# Altium footprint library PCB_ConnectorHDR.PcbLib: 221 footprints (part 3 of 14)
Each footprint in its own frame and in the unit in brackets; x right, y up, seen from the top. Pads: shape width x height; smd on the part's side, far side on the other; paste and mask are expansions set on the pad; w line width, h text height; cw(c..) or ccw(c..) is an arc to the next point about the centre after c.
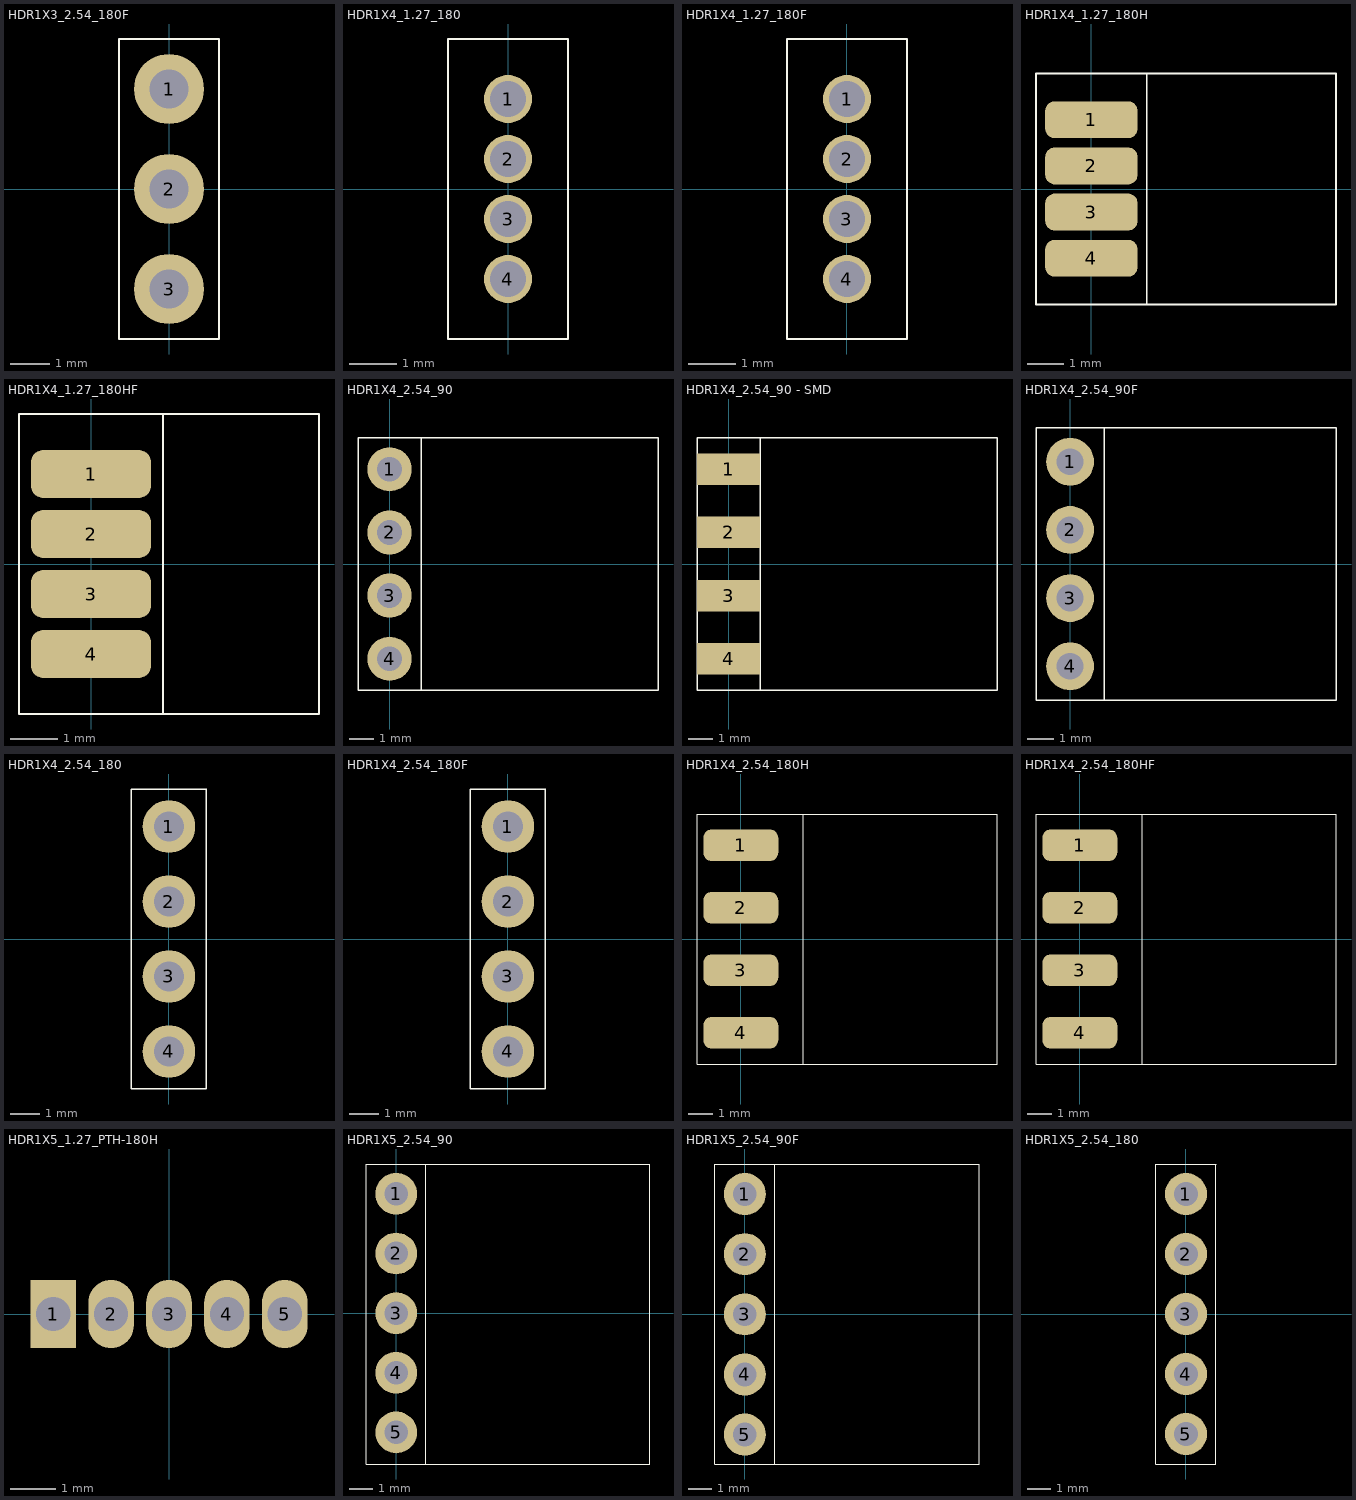
[diagram p2: the footprints below, top view; thin cyan lines are the x and y axes]

## HDR1X3_2.54_180F [mil]
height 169.29
pads (3):
  round 70 hole 39.37: 1(0,100) 2(0,0) 3(0,-100)
Top Overlay:
  lines w2: -50,-150 50,-150 ; -50,-150 -50,150 ; -50,-150 50,-150 ; -50,-150 -50,150 ; -50,150 50,150 ; -50,150 50,150 ; 50,-150 50,150 ; 50,-150 50,150
3D body "female_header_a-bl254-eg-g03d.stp": height 334.65, standoff -125.98, extent -49.21,-154.91 49.22,154.92

## HDR1X4_1.27_180 [mil]
height 169.29
pads (4):
  round 40 hole 30: 1(0,75) 2(0,25) 3(0,-25) 4(0,-75)
Top Overlay:
  lines w2: -50,-125 50,-125 ; -50,-125 -50,125 ; -50,-125 50,-125 ; -50,-125 -50,125 ; -50,125 50,125 ; -50,125 50,125 ; 50,-125 50,125 ; 50,-125 50,125
3D body "pin_header_a-sl127-eg-g04d.stp": height 210.24, standoff -102.36, extent -49.21,-99.99 49.21,100.01

## HDR1X4_1.27_180F [mil]
height 169.29
pads (4):
  round 40 hole 30: 1(0,75) 2(0,25) 3(0,-25) 4(0,-75)
Top Overlay:
  lines w2: -50,-125 -50,125 ; -50,-125 50,-125 ; -50,-125 -50,125 ; -50,-125 50,-125 ; -50,125 50,125 ; -50,125 50,125 ; 50,-125 50,125 ; 50,-125 50,125
3D body "female_header_a-bl127-eg-g04d.stp": height 133.86, standoff -94.49, extent -35.87,-107.88 35,107.88

## HDR1X4_1.27_180H [mil]
height 169.29
pads (4):
  rrect50% 100x40 smd: 1(0,75) 2(0,25) 3(0,-25) 4(0,-75)
Top Overlay:
  lines w2: -60,-125 265,-125 265,125 -60,125 ; -60,-125 -60,125 ; -60,-125 60,-125 60,125 -60,125 ; -60,-125 -60,125
3D body "pin_header_a-sl127-eg-g04d.stp": height 59.21, standoff -39.21, extent -47.36,-99.99 265.24,100.01

## HDR1X4_1.27_180HF [mil]
height 169.29
pads (4):
  rrect50% 100x40 smd: 1(0,75) 2(0,25) 3(0,-25) 4(0,-75)
Top Overlay:
  lines w2: -60,-125 -60,125 ; -60,-125 60,-125 60,125 -60,125 ; -60,-125 190,-125 190,125 -60,125 ; -60,-125 -60,125
3D body "female_header_a-bl127-eg-g04d.stp": height 45.43, standoff -25.43, extent -38.35,-107.88 190,107.88

## HDR1X4_2.54_90 [mil]
height 169.29
pads (4):
  round 70 hole 39.37: 1(0,150) 2(0,50) 3(0,-50) 4(0,-150)
Top Overlay:
  lines w2: -50,-200 50,-200 50,200 -50,200 ; -50,-200 -50,200 ; -50,-200 -50,200 ; -50,-200 425,-200 425,200 -50,200
3D body "pin_header_aw140-ea-g04g.stp": height 99.21, standoff -93.7, extent -14.96,-196.06 423.62,196.07

## HDR1X4_2.54_90 - SMD [mil]
height 169.29
pads (4):
  rect 100x50 smd: 1(0,150) 2(0,50) 3(0,-50) 4(0,-150)
Top Overlay:
  lines w2: -50,-200 -50,200 ; -50,-200 50,-200 50,200 -50,200 ; -50,-200 425,-200 425,200 -50,200 ; -50,-200 -50,200
3D body "pin_header_a-sl254-ea-z04mp1.stp": height 98.93, standoff 0.5, extent -29.11,-200 423.65,200

## HDR1X4_2.54_90F [mil]
height 169.29
pads (4):
  round 70 hole 39.37: 1(0,150) 2(0,50) 3(0,-50) 4(0,-150)
Top Overlay:
  lines w2: -50,-200 -50,200 ; -50,-200 390,-200 390,200 -50,200 ; -50,-200 50,-200 50,200 -50,200 ; -50,-200 -50,200
3D body "female_header_a-bl254-ea-g04d.stp": height 99.21, standoff -125.2, extent -10,-204.92 386.06,204.92

## HDR1X4_2.54_180 [mil]
height 169.29
pads (4):
  round 70 hole 39.37: 1(0,150) 2(0,50) 3(0,-50) 4(0,-150)
Top Overlay:
  lines w2: -50,-200 -50,200 ; -50,-200 50,-200 ; -50,-200 -50,200 ; -50,-200 50,-200 ; -50,200 50,200 ; -50,200 50,200 ; 50,-200 50,200 ; 50,-200 50,200
3D body "pin_header_aw140-eg-g04d.stp": height 322.83, standoff -118.11, extent -49.18,-200 49.18,200

## HDR1X4_2.54_180F [mil]
height 169.29
pads (4):
  round 70 hole 39.37: 1(0,150) 2(0,50) 3(0,-50) 4(0,-150)
Top Overlay:
  lines w2: -50,-200 50,-200 ; -50,-200 -50,200 ; -50,-200 50,-200 ; -50,-200 -50,200 ; -50,200 50,200 ; -50,200 50,200 ; 50,-200 50,200 ; 50,-200 50,200
3D body "User Library-ZL262-4SG.step": height 330.71, standoff -124.02, extent -49.43,-199 49,201

## HDR1X4_2.54_180H [mil]
height 169.29
pads (4):
  rrect50% 120x50 smd: 1(0,150) 2(0,50) 3(0,-50) 4(0,-150)
Top Overlay:
  lines w2: -70,-200 410,-200 410,200 -70,200 ; -70,-200 -70,200 ; -70,-200 -70,200 ; -70,-200 100,-200 100,200 -70,200
3D body "pin_header_aw140-eg-g04d.stp": height 61.32, standoff -37.05, extent -35,-200 405.94,200

## HDR1X4_2.54_180HF [mil]
height 169.29
pads (4):
  rrect50% 120x50 smd: 1(0,150) 2(0,50) 3(0,-50) 4(0,-150)
Top Overlay:
  lines w2: -70,-200 -70,200 ; -70,-200 100,-200 100,200 -70,200 ; -70,-200 410,-200 410,200 -70,200 ; -70,-200 -70,200

## HDR1X5_1.27_PTH-180H [mm]
pads (5):
  rect 1x1.5 hole 0.75: 1(-2.54,0)
  oval 1x1.5 hole 0.75: 2(-1.27,0) 3(0,0) 4(1.27,0) 5(2.54,0)
3D body "_ _ _B051NGCN-RC.STEP": height 2.21, standoff -2.29, extent -3.375,0 3.375,4.975

## HDR1X5_2.54_90 [mil]
height 169.29
pads (5):
  round 70 hole 39.37: 1(0,200) 2(0,100) 3(0,0) 4(0,-100) 5(0,-200)
Top Overlay:
  lines w2: -50,-253 425,-253 425,250 -50,250 ; -50,-253 -50,250 ; -50,-253 50,-253 50,250 -50,250 ; -50,-253 -50,250
3D body "pin_header_aw140-ea-g05g.stp": height 98.93, standoff -93.99, extent -12.96,-247.06 425.62,245.06

## HDR1X5_2.54_90F [mil]
height 169.29
pads (5):
  round 70 hole 39.37: 1(0,200) 2(0,100) 3(0,0) 4(0,-100) 5(0,-200)
Top Overlay:
  lines w2: -50,-249 390,-249 390,250 -50,250 ; -50,-249 -50,250 ; -50,-249 -50,250 ; -50,-249 50,-249 50,250 -50,250
3D body "female_header_a-bl254-ea-g05d.stp": height 98.93, standoff -125.48, extent -9,-254.84 387.06,255

## HDR1X5_2.54_180 [mil]
height 169.29
pads (5):
  round 70 hole 39.37: 1(0,200) 2(0,100) 3(0,0) 4(0,-100) 5(0,-200)
Top Overlay:
  lines w2: -50,-250 -50,250 ; -50,-250 50,-250 ; -50,-250 50,-250 ; -50,-250 -50,250 ; -50,250 50,250 ; -50,250 50,250 ; 50,-250 50,250 ; 50,-250 50,250
3D body "pin_header_aw140-eg-g05d.stp": height 322.83, standoff -118.11, extent -49.18,-250 49.18,250